# Altium footprint library Connectors SMD.PcbLib: 130 footprints (part 6 of 12) (continued)
## SAMTEC_CCH-J-01 [mm] "CCH - Bull's Eye Low Cost High Performance SMA Test Point" (continued)
Drill Drawing:
  lines w0.2: 1.651,0 0.8,0 ; 0.8,0 0.95,0.15 0.95,-0.15 0.8,0
  text "1 Filled hole" at 2.8,-5 h1
3D body: height 3.16, standoff -2.62, extent -1.395,-4.971 1.395,4.977
3D body: height 7.62, standoff 0, extent -3.175,-5.715 3.175,5.715

## SAMTEC_CCH-J-01_old [mm] "CCH - Bull's Eye Low Cost High Performance SMA Test Point"
height 7.62
pads (10):
  round 0.66 hole 0.25: 1(0,0)
  round 0.66 hole 0.4: 2(-1.27,0) 2(-0.898,-0.898) 2(-0.898,0.898) 2(0,-1.27) 2(0,1.27) 2(0.898,-0.898) 2(0.898,0.898)
  round 1 hole 1.7 unplated mask+0.35: 3(0,3.581) 4(0,-3.581)
Top Layer:
  circle w1.84: c0,0 r1.62
Bottom Layer keep-out:
  circle w0.1: c0,-3.581 r1.5
  circle w0.1: c0,3.581 r1.5
Top Overlay:
  lines w0.2: -1.096,-2.98 cw(c0,0) -1.096,2.98 ; 1.096,-2.98 ccw(c0,0) 1.096,2.98 ; 3.038,-0.923 2.041,-4.202 cw(c0,-3.581) -2.041,-4.202 -3.038,-0.923 cw(c0,0) -3.038,0.923 -2.041,4.202 cw(c0,3.581) 2.041,4.202 3.038,0.923
Mechanical 8:
  circle w0.1: c0,0 r1.27
  circle w0.1: c-1.27,0 r0.205
  circle w0.1: c-1.27,0 r0.33
  circle w0.1: c-0.898,-0.898 r0.205
  circle w0.1: c-0.898,-0.898 r0.33
  circle w0.1: c-0.898,0.898 r0.205
  circle w0.1: c-0.898,0.898 r0.33
  circle w0.1: c0,-1.27 r0.205
  circle w0.1: c0,-1.27 r0.33
  circle w0.1: c0.898,-0.898 r0.205
  circle w0.1: c0.898,-0.898 r0.33
  circle w0.1: c0,1.27 r0.205
  circle w0.1: c0,1.27 r0.33
  circle w0.1: c0.898,0.898 r0.205
  circle w0.1: c0.898,0.898 r0.33
  circle w0.1: c0,0 r0.32
  circle w0.1: c0,0 r0.125
  circle w0.1: c0,0 r0.7
  circle w0.1: c0,-3.581 r0.85
  circle w0.1: c0,3.581 r0.85
  circle w0.1: c0,0 r2.54
  lines w0.1: -2.54,0 -1.62,0 -0.7,0 ; -1.415,-0.145 -1.27,0 -1.415,0.145 ; -1.103,-0.898 -0.898,-0.898 -0.898,-1.103 ; -1.103,0.898 -0.898,0.898 -0.898,1.103 ; -0.5,-3.581 0,-3.581 ; -0.5,0 0,0 ; -0.5,3.581 0,3.581 ; -0.145,-1.415 0,-1.27 0.145,-1.415 ; -0.145,1.415 0,1.27 0.145,1.415 ; 0,-4.081 0,-3.581 ; 0,-3.081 0,-3.581 ; 0,-0.5 0,0 ; 0,0.5 0,0 ; 0,3.081 0,3.581 ; 0,4.081 0,3.581 ; 0.5,-3.581 0,-3.581 ; 0.5,0 0,0 ; 0.5,3.581 0,3.581 ; 0.7,0 1.62,0 2.54,0 ; 0.898,-1.103 0.898,-0.898 1.103,-0.898 ; 0.898,1.103 0.898,0.898 1.103,0.898
Mechanical 14:
  circle w0.1: c0,0 r1.378
  circle w0.1: c0,0 r1.651
  circle w0.1: c0,0 r3.175
  lines w0.1: -0.54,-3.129 ccw(c0,-3.581) 0.54,-3.129 ; -0.54,3.129 cw(c0,3.581) 0.54,3.129 ; -3.038,-0.923 cw(c0,0) -3.038,0.923 -2.041,4.202 cw(c0,3.581) 2.041,4.202 3.038,0.923 cw(c0,0) 3.038,-0.923 2.041,-4.202 cw(c0,-3.581) -2.041,-4.202 -3.038,-0.923
Mechanical 15:
  lines w0.05: -3.277,-0.996 cw(c0,0) -3.277,0.996 -2.281,4.275 cw(c0,3.581) 2.281,4.275 3.277,0.996 cw(c0,0) 3.277,-0.996 2.281,-4.275 cw(c0,-3.581) -2.281,-4.275 -3.277,-0.996
Drill Drawing:
  lines w0.2: 1.651,0 0.8,0 ; 0.8,0 0.95,0.15 0.95,-0.15 0.8,0
  text "1 Filled hole" at 2.8,-5 h1
3D body: height 3.16, standoff -2.62, extent -1.395,-4.971 1.395,4.977
3D body: height 7.62, standoff 0, extent -3.175,-5.715 3.175,5.715

## SAMTEC_CCH-J-02 [mm] "2 Positions CCH - Bull's Eye Low Cost High Performance SMA Test Point"
height 7.62
pads (18):
  round 0.66 hole 0.25: 1(-3.302,0) 3(3.302,0)
  round 0.66 hole 0.4 mask-0.2: 2(-4.572,0) 2(-4.2,-0.898) 2(-4.2,0.898) 2(-3.302,1.27) 2(-2.404,-0.898) 2(-2.404,0.898) 2(-2.032,0) 4(2.032,0) 4(2.404,-0.898) 4(2.404,0.898) 4(3.302,1.27) 4(4.2,-0.898) 4(4.2,0.898) 4(4.572,0)
  round 1 hole 1.7 unplated mask+0.35: 5(0,-2.159) 6(0,2.159)
Top Layer:
  region: 0.762,-0.05 2.603,-0.05 2.596,0 2.62,0.183 2.691,0.353 2.803,0.499 2.949,0.611 3.119,0.682 3.302,0.706 3.485,0.682 3.655,0.611 3.801,0.499 3.913,0.353 3.984,0.183 4.008,0 4.001,-0.05 4,-0.05 5.849,-0.05 5.854,0 5.805,0.498 5.66,0.977 5.424,1.418 5.107,1.805 4.72,2.122 4.279,2.358 3.8,2.503 3.302,2.552 2.804,2.503 2.325,2.358 1.884,2.122 1.497,1.805 1.18,1.418 0.944,0.977 0.799,0.498 0.75,0 0.755,-0.05
  region: 0.755,0.05 0.75,0 0.799,-0.498 0.944,-0.977 1.18,-1.418 1.497,-1.805 1.884,-2.122 2.325,-2.358 2.804,-2.503 3.302,-2.552 3.8,-2.503 4.279,-2.358 4.72,-2.122 5.107,-1.805 5.424,-1.418 5.66,-0.977 5.805,-0.498 5.854,0 5.849,0.05 5.842,0.05 4.001,0.05 4.008,0 3.984,-0.183 3.913,-0.353 3.801,-0.499 3.655,-0.611 3.485,-0.682 3.302,-0.706 3.119,-0.682 2.949,-0.611 2.803,-0.499 2.691,-0.353 2.62,-0.183 2.596,0 2.603,0.05 2.604,0.05
  region: -5.842,-0.05 -4.001,-0.05 -4.008,0 -3.984,0.183 -3.913,0.353 -3.801,0.499 -3.655,0.611 -3.485,0.682 -3.302,0.706 -3.119,0.682 -2.949,0.611 -2.803,0.499 -2.691,0.353 -2.62,0.183 -2.596,0 -2.603,-0.05 -2.604,-0.05 -0.755,-0.05 -0.75,0 -0.799,0.498 -0.944,0.977 -1.18,1.418 -1.497,1.805 -1.884,2.122 -2.325,2.358 -2.804,2.503 -3.302,2.552 -3.8,2.503 -4.279,2.358 -4.72,2.122 -5.107,1.805 -5.424,1.418 -5.66,0.977 -5.805,0.498 -5.854,0 -5.849,-0.05
  region: -5.849,0.05 -5.854,0 -5.805,-0.498 -5.66,-0.977 -5.424,-1.418 -5.107,-1.805 -4.72,-2.122 -4.279,-2.358 -3.8,-2.503 -3.302,-2.552 -2.804,-2.503 -2.325,-2.358 -1.884,-2.122 -1.497,-1.805 -1.18,-1.418 -0.944,-0.977 -0.799,-0.498 -0.75,0 -0.755,0.05 -0.762,0.05 -2.603,0.05 -2.596,0 -2.62,-0.183 -2.691,-0.353 -2.803,-0.499 -2.949,-0.611 -3.119,-0.682 -3.302,-0.706 -3.485,-0.682 -3.655,-0.611 -3.801,-0.499 -3.913,-0.353 -3.984,-0.183 -4.008,0 -4.001,0.05 -4,0.05
Bottom Layer keep-out:
  circle w0.1: c0,-2.159 r1.5
  circle w0.1: c0,2.159 r1.5
Top Overlay:
  lines w0.2: -3.302,-3.175 -1.901,-3.175 cw(c-1.901,-3.429) -1.69,-3.288 ccw(c0,-2.159) 1.69,-3.288 cw(c1.901,-3.429) 1.901,-3.175 3.302,-3.175 ; -3.302,3.175 -1.901,3.175 ccw(c-1.901,3.429) -1.69,3.288 cw(c0,2.159) 1.69,3.288 ccw(c1.901,3.429) 1.901,3.175 3.302,3.175 ; -1.259,-2.43 cw(c-3.302,0) -1.25,2.423 ; 1.261,2.432 cw(c3.302,0) 1.295,-2.46
Bottom Solder:
  circle w0.33: c4.2,-0.898 r0.165
  circle w0.33: c4.572,0 r0.165
  circle w0.33: c4.2,0.898 r0.165
  circle w0.33: c3.302,1.27 r0.165
  circle w0.33: c2.404,0.898 r0.165
  circle w0.33: c2.032,0 r0.165
  circle w0.33: c2.404,-0.898 r0.165
  circle w0.33: c-2.404,-0.898 r0.165
  circle w0.33: c-2.032,0 r0.165
  circle w0.33: c-2.404,0.898 r0.165
  circle w0.33: c-3.302,1.27 r0.165
  circle w0.33: c-4.2,0.898 r0.165
  circle w0.33: c-4.572,0 r0.165
  circle w0.33: c-4.2,-0.898 r0.165
Mechanical 8:
  circle w0.127: c-3.302,0 r1.27
  circle w0.127: c-3.302,1.27 r0.205
  circle w0.127: c-3.302,1.27 r0.33
  circle w0.127: c-4.2,0.898 r0.205
  circle w0.127: c-4.2,0.898 r0.33
  circle w0.127: c-2.404,0.898 r0.205
  circle w0.127: c-2.404,0.898 r0.33
  circle w0.127: c-4.572,0 r0.205
  circle w0.127: c-4.572,0 r0.33
  circle w0.127: c-4.2,-0.898 r0.205
  circle w0.127: c-4.2,-0.898 r0.33
  circle w0.127: c-2.032,0 r0.205
  circle w0.127: c-2.032,0 r0.33
  circle w0.127: c-2.404,-0.898 r0.205
  circle w0.127: c-2.404,-0.898 r0.33
  circle w0.127: c-3.302,0 r0.32
  circle w0.127: c-3.302,0 r0.125
  circle w0.127: c-3.302,0 r0.7
  circle w0.127: c-3.302,0 r2.54
  circle w0.127: c-3.302,0 r1.62
  circle w0.127: c3.302,0 r1.27
  circle w0.127: c3.302,1.27 r0.205
  circle w0.127: c3.302,1.27 r0.33
  circle w0.127: c2.404,0.898 r0.205
  circle w0.127: c2.404,0.898 r0.33
  circle w0.127: c4.2,0.898 r0.205
  circle w0.127: c4.2,0.898 r0.33
  circle w0.127: c2.032,0 r0.205
  circle w0.127: c2.032,0 r0.33
  circle w0.127: c2.404,-0.898 r0.205
  circle w0.127: c2.404,-0.898 r0.33
  circle w0.127: c4.572,0 r0.205
  circle w0.127: c4.572,0 r0.33
  circle w0.127: c4.2,-0.898 r0.205
  circle w0.127: c4.2,-0.898 r0.33
  circle w0.127: c3.302,0 r0.32
  circle w0.127: c3.302,0 r0.125
  circle w0.127: c3.302,0 r0.7
  circle w0.127: c3.302,0 r2.54
  circle w0.127: c3.302,0 r1.62
  lines w0.127: -4.717,-0.145 -4.572,0 -4.717,0.145 ; -4.405,-0.898 -4.2,-0.898 -4.2,-1.103 ; -4.405,0.898 -4.2,0.898 -4.2,1.103 ; -3.447,1.415 -3.302,1.27 -3.157,1.415 ; -3.302,2.54 -3.302,1.62 ; -2.404,-1.103 -2.404,-0.898 -2.199,-0.898 ; -2.404,1.103 -2.404,0.898 -2.199,0.898 ; -1.887,-0.145 -2.032,0 -1.887,0.145 ; -1.682,0 -0.762,0 ; -0.5,-2.159 0,-2.159 ; -0.5,2.159 0,2.159 ; 0,-2.659 0,-2.159 ; 0,-1.659 0,-2.159 ; 0,-0.5 0,0 ; 0,0.5 0,0 ; 0,1.659 0,2.159 ; 0,2.659 0,2.159 ; 0.5,-2.159 0,-2.159 ; 0.5,2.159 0,2.159 ; 1.887,-0.145 2.032,0 1.887,0.145 ; 2.199,-0.898 2.404,-0.898 2.404,-1.103 ; 2.199,0.898 2.404,0.898 2.404,1.103 ; 3.157,1.415 3.302,1.27 3.447,1.415 ; 3.302,2.54 3.302,1.62 ; 4.2,-1.103 4.2,-0.898 4.405,-0.898 ; 4.2,1.103 4.2,0.898 4.405,0.898 ; 4.717,-0.145 4.572,0 4.717,0.145 ; 4.922,0 5.842,0 ; -3.302,0 -3.302,-0.5 -3.302,0 ; -3.302,0 -3.802,0 -3.302,0 ; -3.302,0 -3.302,0.5 -3.302,0 ; -3.302,0 -2.802,0 -3.302,0 ; -3.302,1.62 -3.302,0.7 -3.302,1.62 ; 0,0 -0.5,0 0,0 ; 0,0 0.5,0 0,0 ; 3.302,0 3.302,-0.5 3.302,0 ; 3.302,0 2.802,0 3.302,0 ; 3.302,0 3.302,0.5 3.302,0 ; 3.302,0 3.802,0 3.302,0 ; 3.302,1.62 3.302,0.7 3.302,1.62
Mechanical 14:
  circle w0.1: c-3.302,0 r1.378
  circle w0.1: c-3.302,0 r1.651
  circle w0.1: c3.302,0 r1.378
  circle w0.1: c3.302,0 r1.651
  circle w0.1: c0,2.159 r0.679
  circle w0.1: c0,-2.159 r0.679
  lines w0.1: -4.225,-3.038 ccw(c-3.302,0) -2.379,-3.038 ; -4.225,3.038 cw(c-3.302,0) -2.379,3.038 ; -3.302,-3.175 -1.901,-3.175 cw(c-1.901,-3.429) -1.69,-3.288 ccw(c0,-2.159) 1.69,-3.288 cw(c1.901,-3.429) 1.901,-3.175 3.302,-3.175 ; -3.302,3.175 -1.901,3.175 ccw(c-1.901,3.429) -1.69,3.288 cw(c0,2.159) 1.69,3.288 ccw(c1.901,3.429) 1.901,3.175 3.302,3.175 ; 2.379,-3.038 ccw(c3.302,0) 4.225,-3.038 ; 2.379,3.038 cw(c3.302,0) 4.225,3.038 ; -0.34,-1.143 cw(c-3.302,0) -0.34,1.143 0.34,1.143 cw(c3.302,0) 0.34,-1.143 -0.34,-1.143
Mechanical 15:
  lines w0.05: -1.901,-3.425 -3.302,-3.425 cw(c-3.302,0) -3.302,3.425 -1.901,3.425 ; -1.897,-3.427 ccw(c0,-2.159) 1.897,-3.427 ; -1.897,3.427 cw(c0,2.159) 1.897,3.427 ; 1.901,-3.425 3.302,-3.425 ccw(c3.302,0) 3.302,3.425 1.901,3.425
Drill Drawing:
  lines w0.1: -3.302,2.9 -3.302,0.8 ; 3.302,2.9 3.302,0.8 ; -3.302,0.8 -3.152,0.95 -3.452,0.95 -3.302,0.8 ; 3.302,0.8 3.452,0.95 3.152,0.95 3.302,0.8
  text "2 Filled holes" at -6.5,3.3 h1
3D body: height 7.62, standoff 0, extent -6.477,-4.171 6.477,4.171
3D body: height 3.16, standoff -2.62, extent -1.395,-3.55 1.395,3.554

## SAMTEC_CCH-J-02_old [mm] "2 Positions CCH - Bull's Eye Low Cost High Performance SMA Test Point"
height 7.62
pads (18):
  round 0.66 hole 0.25: 1(-3.302,0) 3(3.302,0)
  round 0.66 hole 0.4: 2(-4.572,0) 2(-4.2,-0.898) 2(-4.2,0.898) 2(-3.302,1.27) 2(-2.404,-0.898) 2(-2.404,0.898) 2(-2.032,0) 4(2.032,0) 4(2.404,-0.898) 4(2.404,0.898) 4(3.302,1.27) 4(4.2,-0.898) 4(4.2,0.898) 4(4.572,0)
  round 1 hole 1.7 unplated mask+0.35: 5(0,-2.159) 6(0,2.159)
Top Layer:
  circle w1.84: c3.302,0 r1.62
  circle w1.84: c-3.302,0 r1.62
Bottom Layer keep-out:
  circle w0.1: c0,2.159 r1.5
  circle w0.1: c0,-2.159 r1.5
Top Overlay:
  lines w0.2: -4.225,-3.038 ccw(c-3.302,0) -2.379,-3.038 ; -4.225,3.038 cw(c-3.302,0) -2.379,3.038 ; -3.302,-3.175 -1.901,-3.175 cw(c-1.901,-3.429) -1.69,-3.288 ccw(c0,-2.159) 1.69,-3.288 cw(c1.901,-3.429) 1.901,-3.175 3.302,-3.175 ; -3.302,3.175 -1.901,3.175 ccw(c-1.901,3.429) -1.69,3.288 cw(c0,2.159) 1.69,3.288 ccw(c1.901,3.429) 1.901,3.175 3.302,3.175 ; -1.074,-2.262 cw(c-3.302,0) -1.074,2.262 ; 1.074,-2.262 ccw(c3.302,0) 1.074,2.262 ; 2.379,-3.038 ccw(c3.302,0) 4.225,-3.038 ; 2.379,3.038 cw(c3.302,0) 4.225,3.038
Mechanical 8:
  circle w0.127: c3.302,0 r1.62
  circle w0.127: c3.302,0 r2.54
  circle w0.127: c3.302,0 r0.7
  circle w0.127: c3.302,0 r0.125
  circle w0.127: c3.302,0 r0.32
  circle w0.127: c4.2,-0.898 r0.33
  circle w0.127: c4.2,-0.898 r0.205
  circle w0.127: c4.572,0 r0.33
  circle w0.127: c4.572,0 r0.205
  circle w0.127: c2.404,-0.898 r0.33
  circle w0.127: c2.404,-0.898 r0.205
  circle w0.127: c2.032,0 r0.33
  circle w0.127: c2.032,0 r0.205
  circle w0.127: c4.2,0.898 r0.33
  circle w0.127: c4.2,0.898 r0.205
  circle w0.127: c2.404,0.898 r0.33
  circle w0.127: c2.404,0.898 r0.205
  circle w0.127: c3.302,1.27 r0.33
  circle w0.127: c3.302,1.27 r0.205
  circle w0.127: c3.302,0 r1.27
  circle w0.127: c-3.302,0 r1.62
  circle w0.127: c-3.302,0 r2.54
  circle w0.127: c-3.302,0 r0.7
  circle w0.127: c-3.302,0 r0.125
  circle w0.127: c-3.302,0 r0.32
  circle w0.127: c-2.404,-0.898 r0.33
  circle w0.127: c-2.404,-0.898 r0.205
  circle w0.127: c-2.032,0 r0.33
  circle w0.127: c-2.032,0 r0.205
  circle w0.127: c-4.2,-0.898 r0.33
  circle w0.127: c-4.2,-0.898 r0.205
  circle w0.127: c-4.572,0 r0.33
  circle w0.127: c-4.572,0 r0.205
  circle w0.127: c-2.404,0.898 r0.33
  circle w0.127: c-2.404,0.898 r0.205
  circle w0.127: c-4.2,0.898 r0.33
  circle w0.127: c-4.2,0.898 r0.205
  circle w0.127: c-3.302,1.27 r0.33
  circle w0.127: c-3.302,1.27 r0.205
  circle w0.127: c-3.302,0 r1.27
  lines w0.127: -4.717,-0.145 -4.572,0 -4.717,0.145 ; -4.405,-0.898 -4.2,-0.898 -4.2,-1.103 ; -4.405,0.898 -4.2,0.898 -4.2,1.103 ; -3.447,1.415 -3.302,1.27 -3.157,1.415 ; -3.302,2.54 -3.302,1.62 ; -2.404,-1.103 -2.404,-0.898 -2.199,-0.898 ; -2.404,1.103 -2.404,0.898 -2.199,0.898 ; -1.887,-0.145 -2.032,0 -1.887,0.145 ; -1.682,0 -0.762,0 ; -0.5,-2.159 0,-2.159 ; -0.5,2.159 0,2.159 ; 0,-2.659 0,-2.159 ; 0,-1.659 0,-2.159 ; 0,-0.5 0,0 ; 0,0.5 0,0 ; 0,1.659 0,2.159 ; 0,2.659 0,2.159 ; 0.5,-2.159 0,-2.159 ; 0.5,2.159 0,2.159 ; 1.887,-0.145 2.032,0 1.887,0.145 ; 2.199,-0.898 2.404,-0.898 2.404,-1.103 ; 2.199,0.898 2.404,0.898 2.404,1.103 ; 3.157,1.415 3.302,1.27 3.447,1.415 ; 3.302,2.54 3.302,1.62 ; 4.2,-1.103 4.2,-0.898 4.405,-0.898 ; 4.2,1.103 4.2,0.898 4.405,0.898 ; 4.717,-0.145 4.572,0 4.717,0.145 ; 4.922,0 5.842,0 ; -3.302,0 -3.302,-0.5 -3.302,0 ; -3.302,0 -2.802,0 -3.302,0 ; -3.302,0 -3.302,0.5 -3.302,0 ; -3.302,0 -3.802,0 -3.302,0 ; -3.302,1.62 -3.302,0.7 -3.302,1.62 ; 0,0 0.5,0 0,0 ; 0,0 -0.5,0 0,0 ; 3.302,0 3.302,-0.5 3.302,0 ; 3.302,0 3.802,0 3.302,0 ; 3.302,0 3.302,0.5 3.302,0 ; 3.302,0 2.802,0 3.302,0 ; 3.302,1.62 3.302,0.7 3.302,1.62
Mechanical 14:
  circle w0.1: c0,-2.159 r0.679
  circle w0.1: c0,2.159 r0.679
  circle w0.1: c3.302,0 r1.651
  circle w0.1: c3.302,0 r1.378
  circle w0.1: c-3.302,0 r1.651
  circle w0.1: c-3.302,0 r1.378
  lines w0.1: -4.225,-3.038 ccw(c-3.302,0) -2.379,-3.038 ; -4.225,3.038 cw(c-3.302,0) -2.379,3.038 ; -3.302,-3.175 -1.901,-3.175 cw(c-1.901,-3.429) -1.69,-3.288 ccw(c0,-2.159) 1.69,-3.288 cw(c1.901,-3.429) 1.901,-3.175 3.302,-3.175 ; -3.302,3.175 -1.901,3.175 ccw(c-1.901,3.429) -1.69,3.288 cw(c0,2.159) 1.69,3.288 ccw(c1.901,3.429) 1.901,3.175 3.302,3.175 ; 2.379,-3.038 ccw(c3.302,0) 4.225,-3.038 ; 2.379,3.038 cw(c3.302,0) 4.225,3.038 ; -0.34,-1.143 cw(c-3.302,0) -0.34,1.143 0.34,1.143 cw(c3.302,0) 0.34,-1.143 -0.34,-1.143
Mechanical 15:
  lines w0.05: -1.901,-3.425 -3.302,-3.425 cw(c-3.302,0) -3.302,3.425 -1.901,3.425 ; -1.897,-3.427 ccw(c0,-2.159) 1.897,-3.427 ; -1.897,3.427 cw(c0,2.159) 1.897,3.427 ; 1.901,-3.425 3.302,-3.425 ccw(c3.302,0) 3.302,3.425 1.901,3.425
Drill Drawing:
  lines w0.1: -3.302,2.9 -3.302,0.8 ; 3.302,2.9 3.302,0.8 ; -3.302,0.8 -3.452,0.95 -3.152,0.95 -3.302,0.8 ; 3.302,0.8 3.152,0.95 3.452,0.95 3.302,0.8
  text "2 Filled holes" at -6.5,3.3 h1
3D body: height 3.16, standoff -2.62, extent -1.395,-3.55 1.395,3.554
3D body: height 7.62, standoff 0, extent -6.477,-4.171 6.477,4.171

## SAMTEC_CCH-J-04 [mm] "4 Positions CCH - Bull's Eye Low Cost High Performance SMA Test Point"
height 7.62
pads (36):
  round 0.66 hole 0.25: 1(-9.902,0) 3(-3.298,0) 5(3.298,0) 7(9.902,0)
  round 0.66 hole 0.4 mask-0.2: 2(-11.172,0) 2(-10.8,-0.898) 2(-10.8,0.898) 2(-9.902,1.27) 2(-9.004,-0.898) 2(-9.004,0.898) 2(-8.632,0) 4(-4.568,0) 4(-4.196,-0.898) 4(-4.196,0.898) 4(-3.298,1.27) 4(-2.4,-0.898) 4(-2.4,0.898) 4(-2.028,0) 6(2.028,0) 6(2.4,-0.898) 6(2.4,0.898) 6(3.298,1.27) 6(4.196,-0.898) 6(4.196,0.898) 6(4.568,0) 8(8.632,0) 8(9.004,-0.898) 8(9.004,0.898) 8(9.902,1.27) 8(10.8,-0.898) 8(10.8,0.898) 8(11.172,0)
  round 1 hole 1.7 unplated mask+0.35: 9(-6.6,2.159) 10(-6.6,-2.159) 11(6.6,-2.159) 12(6.6,2.159)
Top Layer:
  region: 7.362,-0.05 9.203,-0.05 9.196,0 9.22,0.183 9.291,0.353 9.403,0.499 9.549,0.611 9.719,0.682 9.902,0.706 10.085,0.682 10.255,0.611 10.401,0.499 10.513,0.353 10.584,0.183 10.608,0 10.601,-0.05 10.6,-0.05 12.449,-0.05 12.454,0 12.405,0.498 12.26,0.977 12.024,1.418 11.707,1.805 11.32,2.122 10.879,2.358 10.4,2.503 9.902,2.552 9.404,2.503 8.925,2.358 8.484,2.122 8.097,1.805 7.78,1.418 7.544,0.977 7.399,0.498 7.35,0 7.355,-0.05
  region: 7.355,0.05 7.35,0 7.399,-0.498 7.544,-0.977 7.78,-1.418 8.097,-1.805 8.484,-2.122 8.925,-2.358 9.404,-2.503 9.902,-2.552 10.4,-2.503 10.879,-2.358 11.32,-2.122 11.707,-1.805 12.024,-1.418 12.26,-0.977 12.405,-0.498 12.454,0 12.449,0.05 12.442,0.05 10.601,0.05 10.608,0 10.584,-0.183 10.513,-0.353 10.401,-0.499 10.255,-0.611 10.085,-0.682 9.902,-0.706 9.719,-0.682 9.549,-0.611 9.403,-0.499 9.291,-0.353 9.22,-0.183 9.196,0 9.203,0.05 9.204,0.05
  region: 0.762,-0.05 2.603,-0.05 2.596,0 2.62,0.183 2.691,0.353 2.803,0.499 2.949,0.611 3.119,0.682 3.302,0.706 3.485,0.682 3.655,0.611 3.801,0.499 3.913,0.353 3.984,0.183 4.008,0 4.001,-0.05 4,-0.05 5.849,-0.05 5.854,0 5.805,0.498 5.66,0.977 5.424,1.418 5.107,1.805 4.72,2.122 4.279,2.358 3.8,2.503 3.302,2.552 2.804,2.503 2.325,2.358 1.884,2.122 1.497,1.805 1.18,1.418 0.944,0.977 0.799,0.498 0.75,0 0.755,-0.05
  region: 0.755,0.05 0.75,0 0.799,-0.498 0.944,-0.977 1.18,-1.418 1.497,-1.805 1.884,-2.122 2.325,-2.358 2.804,-2.503 3.302,-2.552 3.8,-2.503 4.279,-2.358 4.72,-2.122 5.107,-1.805 5.424,-1.418 5.66,-0.977 5.805,-0.498 5.854,0 5.849,0.05 5.842,0.05 4.001,0.05 4.008,0 3.984,-0.183 3.913,-0.353 3.801,-0.499 3.655,-0.611 3.485,-0.682 3.302,-0.706 3.119,-0.682 2.949,-0.611 2.803,-0.499 2.691,-0.353 2.62,-0.183 2.596,0 2.603,0.05 2.604,0.05
  region: -5.842,-0.05 -4.001,-0.05 -4.008,0 -3.984,0.183 -3.913,0.353 -3.801,0.499 -3.655,0.611 -3.485,0.682 -3.302,0.706 -3.119,0.682 -2.949,0.611 -2.803,0.499 -2.691,0.353 -2.62,0.183 -2.596,0 -2.603,-0.05 -2.604,-0.05 -0.755,-0.05 -0.75,0 -0.799,0.498 -0.944,0.977 -1.18,1.418 -1.497,1.805 -1.884,2.122 -2.325,2.358 -2.804,2.503 -3.302,2.552 -3.8,2.503 -4.279,2.358 -4.72,2.122 -5.107,1.805 -5.424,1.418 -5.66,0.977 -5.805,0.498 -5.854,0 -5.849,-0.05
  region: -5.849,0.05 -5.854,0 -5.805,-0.498 -5.66,-0.977 -5.424,-1.418 -5.107,-1.805 -4.72,-2.122 -4.279,-2.358 -3.8,-2.503 -3.302,-2.552 -2.804,-2.503 -2.325,-2.358 -1.884,-2.122 -1.497,-1.805 -1.18,-1.418 -0.944,-0.977 -0.799,-0.498 -0.75,0 -0.755,0.05 -0.762,0.05 -2.603,0.05 -2.596,0 -2.62,-0.183 -2.691,-0.353 -2.803,-0.499 -2.949,-0.611 -3.119,-0.682 -3.302,-0.706 -3.485,-0.682 -3.655,-0.611 -3.801,-0.499 -3.913,-0.353 -3.984,-0.183 -4.008,0 -4.001,0.05 -4,0.05
  region: -12.446,-0.05 -10.605,-0.05 -10.612,0 -10.588,0.183 -10.517,0.353 -10.405,0.499 -10.259,0.611 -10.089,0.682 -9.906,0.706 -9.723,0.682 -9.553,0.611 -9.407,0.499 -9.295,0.353 -9.224,0.183 -9.2,0 -9.207,-0.05 -9.208,-0.05 -7.359,-0.05 -7.354,0 -7.403,0.498 -7.548,0.977 -7.784,1.418 -8.101,1.805 -8.488,2.122 -8.929,2.358 -9.408,2.503 -9.906,2.552 -10.404,2.503 -10.883,2.358 -11.324,2.122 -11.711,1.805 -12.028,1.418 -12.264,0.977 -12.409,0.498 -12.458,0 -12.453,-0.05
  region: -12.453,0.05 -12.458,0 -12.409,-0.498 -12.264,-0.977 -12.028,-1.418 -11.711,-1.805 -11.324,-2.122 -10.883,-2.358 -10.404,-2.503 -9.906,-2.552 -9.408,-2.503 -8.929,-2.358 -8.488,-2.122 -8.101,-1.805 -7.784,-1.418 -7.548,-0.977 -7.403,-0.498 -7.354,0 -7.359,0.05 -7.366,0.05 -9.207,0.05 -9.2,0 -9.224,-0.183 -9.295,-0.353 -9.407,-0.499 -9.553,-0.611 -9.723,-0.682 -9.906,-0.706 -10.089,-0.682 -10.259,-0.611 -10.405,-0.499 -10.517,-0.353 -10.588,-0.183 -10.612,0 -10.605,0.05 -10.604,0.05
Bottom Layer keep-out:
  circle w0.1: c-6.604,-2.159 r1.5
  circle w0.1: c-6.604,2.159 r1.5
  circle w0.1: c6.604,-2.159 r1.5
  circle w0.1: c6.604,2.159 r1.5
Top Overlay:
  lines w0.2: -9.906,-3.175 -8.505,-3.175 cw(c-8.505,-3.429) -8.294,-3.288 ccw(c-6.604,-2.159) -4.914,-3.288 cw(c-4.703,-3.429) -4.703,-3.175 4.703,-3.175 cw(c4.703,-3.429) 4.914,-3.288 ccw(c6.604,-2.159) 8.294,-3.288 cw(c8.505,-3.429) 8.505,-3.175 9.906,-3.175 ; -9.906,3.175 -8.505,3.175 ccw(c-8.505,3.429) -8.294,3.288 cw(c-6.604,2.159) -4.914,3.288 ccw(c-4.703,3.429) -4.703,3.175 4.703,3.175 ccw(c4.703,3.429) 4.914,3.288 cw(c6.604,2.159) 8.294,3.288 ccw(c8.505,3.429) 8.505,3.175 9.906,3.175 ; -7.859,-2.43 cw(c-9.902,0) -7.85,2.423 ; -5.336,-2.438 ccw(c-3.302,0) -0.34,-1.143 0.34,-1.143 ccw(c3.302,0) 5.296,-2.471 ; -5.306,2.462 cw(c-3.302,0) -0.34,1.143 0.34,1.143 cw(c3.302,0) 5.325,2.447 ; 7.85,-2.423 ccw(c9.902,0) 7.956,2.509
Bottom Solder:
  circle w0.33: c-10.8,-0.898 r0.165
  circle w0.33: c-11.172,0 r0.165
  circle w0.33: c-10.8,0.898 r0.165
  circle w0.33: c-9.902,1.27 r0.165
  circle w0.33: c-9.004,0.898 r0.165
  circle w0.33: c-8.632,0 r0.165
  circle w0.33: c-9.004,-0.898 r0.165
  circle w0.33: c-4.196,-0.898 r0.165
  circle w0.33: c-4.568,0 r0.165
  circle w0.33: c-4.196,0.898 r0.165
  circle w0.33: c-3.298,1.27 r0.165
  circle w0.33: c-2.4,0.898 r0.165
  circle w0.33: c-2.028,0 r0.165
  circle w0.33: c-2.4,-0.898 r0.165
  circle w0.33: c2.4,-0.898 r0.165
  circle w0.33: c2.028,0 r0.165
  circle w0.33: c2.4,0.898 r0.165
  circle w0.33: c3.298,1.27 r0.165
  circle w0.33: c4.196,0.898 r0.165
  circle w0.33: c4.568,0 r0.165
  circle w0.33: c9.004,-0.898 r0.165
  circle w0.33: c8.632,0 r0.165
  circle w0.33: c9.004,0.898 r0.165
  circle w0.33: c9.902,1.27 r0.165
  circle w0.33: c10.8,0.898 r0.165
  circle w0.33: c11.172,0 r0.165
  circle w0.33: c10.8,-0.898 r0.165
Mechanical 8:
  drawing of 224 lines, arcs and shapes, not listed
Mechanical 14:
  circle w0.1: c-6.604,-2.159 r0.679
  circle w0.1: c-6.604,2.159 r0.679
  circle w0.1: c-3.302,0 r1.651
  circle w0.1: c-3.302,0 r1.378
  circle w0.1: c-9.906,0 r1.651
  circle w0.1: c-9.906,0 r1.378
  circle w0.1: c6.604,-2.159 r0.679
  circle w0.1: c6.604,2.159 r0.679
  circle w0.1: c9.906,0 r1.651
  circle w0.1: c9.906,0 r1.378
  circle w0.1: c3.302,0 r1.651
  circle w0.1: c3.302,0 r1.378
  lines w0.1: -10.829,-3.038 ccw(c-9.906,0) -8.983,-3.038 ; -10.829,3.038 cw(c-9.906,0) -8.983,3.038 ; -9.906,-3.175 -8.505,-3.175 cw(c-8.505,-3.429) -8.294,-3.288 ccw(c-6.604,-2.159) -4.914,-3.288 cw(c-4.703,-3.429) -4.703,-3.175 4.703,-3.175 cw(c4.703,-3.429) 4.914,-3.288 ccw(c6.604,-2.159) 8.294,-3.288 cw(c8.505,-3.429) 8.505,-3.175 9.906,-3.175 ; -9.906,3.175 -8.505,3.175 ccw(c-8.505,3.429) -8.294,3.288 cw(c-6.604,2.159) -4.914,3.288 ccw(c-4.703,3.429) -4.703,3.175 4.703,3.175 ccw(c4.703,3.429) 4.914,3.288 cw(c6.604,2.159) 8.294,3.288 ccw(c8.505,3.429) 8.505,3.175 9.906,3.175 ; -4.225,-3.038 ccw(c-3.302,0) -2.379,-3.038 ; -4.225,3.038 cw(c-3.302,0) -2.379,3.038 ; 2.379,-3.038 ccw(c3.302,0) 4.225,-3.038 ; 2.379,3.038 cw(c3.302,0) 4.225,3.038 ; 8.983,-3.038 ccw(c9.906,0) 10.829,-3.038 ; 8.983,3.038 cw(c9.906,0) 10.829,3.038 ; -6.944,-1.143 cw(c-9.906,0) -6.944,1.143 -6.264,1.143 cw(c-3.302,0) -0.34,1.143 0.34,1.143 cw(c3.302,0) 6.264,1.143 6.944,1.143 cw(c9.906,0) 6.944,-1.143 6.264,-1.143 cw(c3.302,0) 0.34,-1.143 -0.34,-1.143 cw(c-3.302,0) -6.264,-1.143 -6.944,-1.143
Mechanical 15:
  lines w0.05: -8.505,-3.425 -9.906,-3.425 cw(c-9.906,0) -9.906,3.425 -8.505,3.425 ; -8.501,-3.427 ccw(c-6.604,-2.159) -4.707,-3.427 ; -8.501,3.427 cw(c-6.604,2.159) -4.707,3.427 ; -4.703,-3.425 4.703,-3.425 ; -4.703,3.425 4.703,3.425 ; 4.707,-3.427 ccw(c6.604,-2.159) 8.501,-3.427 ; 4.707,3.427 cw(c6.604,2.159) 8.501,3.427 ; 8.505,-3.425 9.906,-3.425 ccw(c9.906,0) 9.906,3.425 8.505,3.425
Drill Drawing:
  lines w0.1: -7.8,2.9 -9.9,2.9 -9.9,0.8 ; -3.296,2.9 -3.296,0.8 ; 3.3,2.9 3.3,0.8 ; 7.804,2.9 9.904,2.9 9.904,0.8 ; -9.9,0.8 -10.05,0.95 -9.75,0.95 -9.9,0.8 ; -3.296,0.8 -3.446,0.95 -3.146,0.95 -3.296,0.8 ; 3.3,0.8 3.15,0.95 3.45,0.95 3.3,0.8 ; 9.904,0.8 9.754,0.95 10.054,0.95 9.904,0.8
  text "4 Filled holes" at -6.5,3.3 h1
3D body: height 3.16, standoff -2.62, extent -7.999,-3.55 7.999,3.554
3D body: height 7.62, standoff 0, extent -13.081,-4.171 13.081,4.171